# Altium footprint library Inductors&Transformers.PcbLib: 69 footprints (part 4 of 5)
Each footprint in its own frame and in the unit in brackets; x right, y up, seen from the top. Pads: shape width x height; smd on the part's side, far side on the other; paste and mask are expansions set on the pad; w line width, h text height; cw(c..) or ccw(c..) is an arc to the next point about the centre after c.
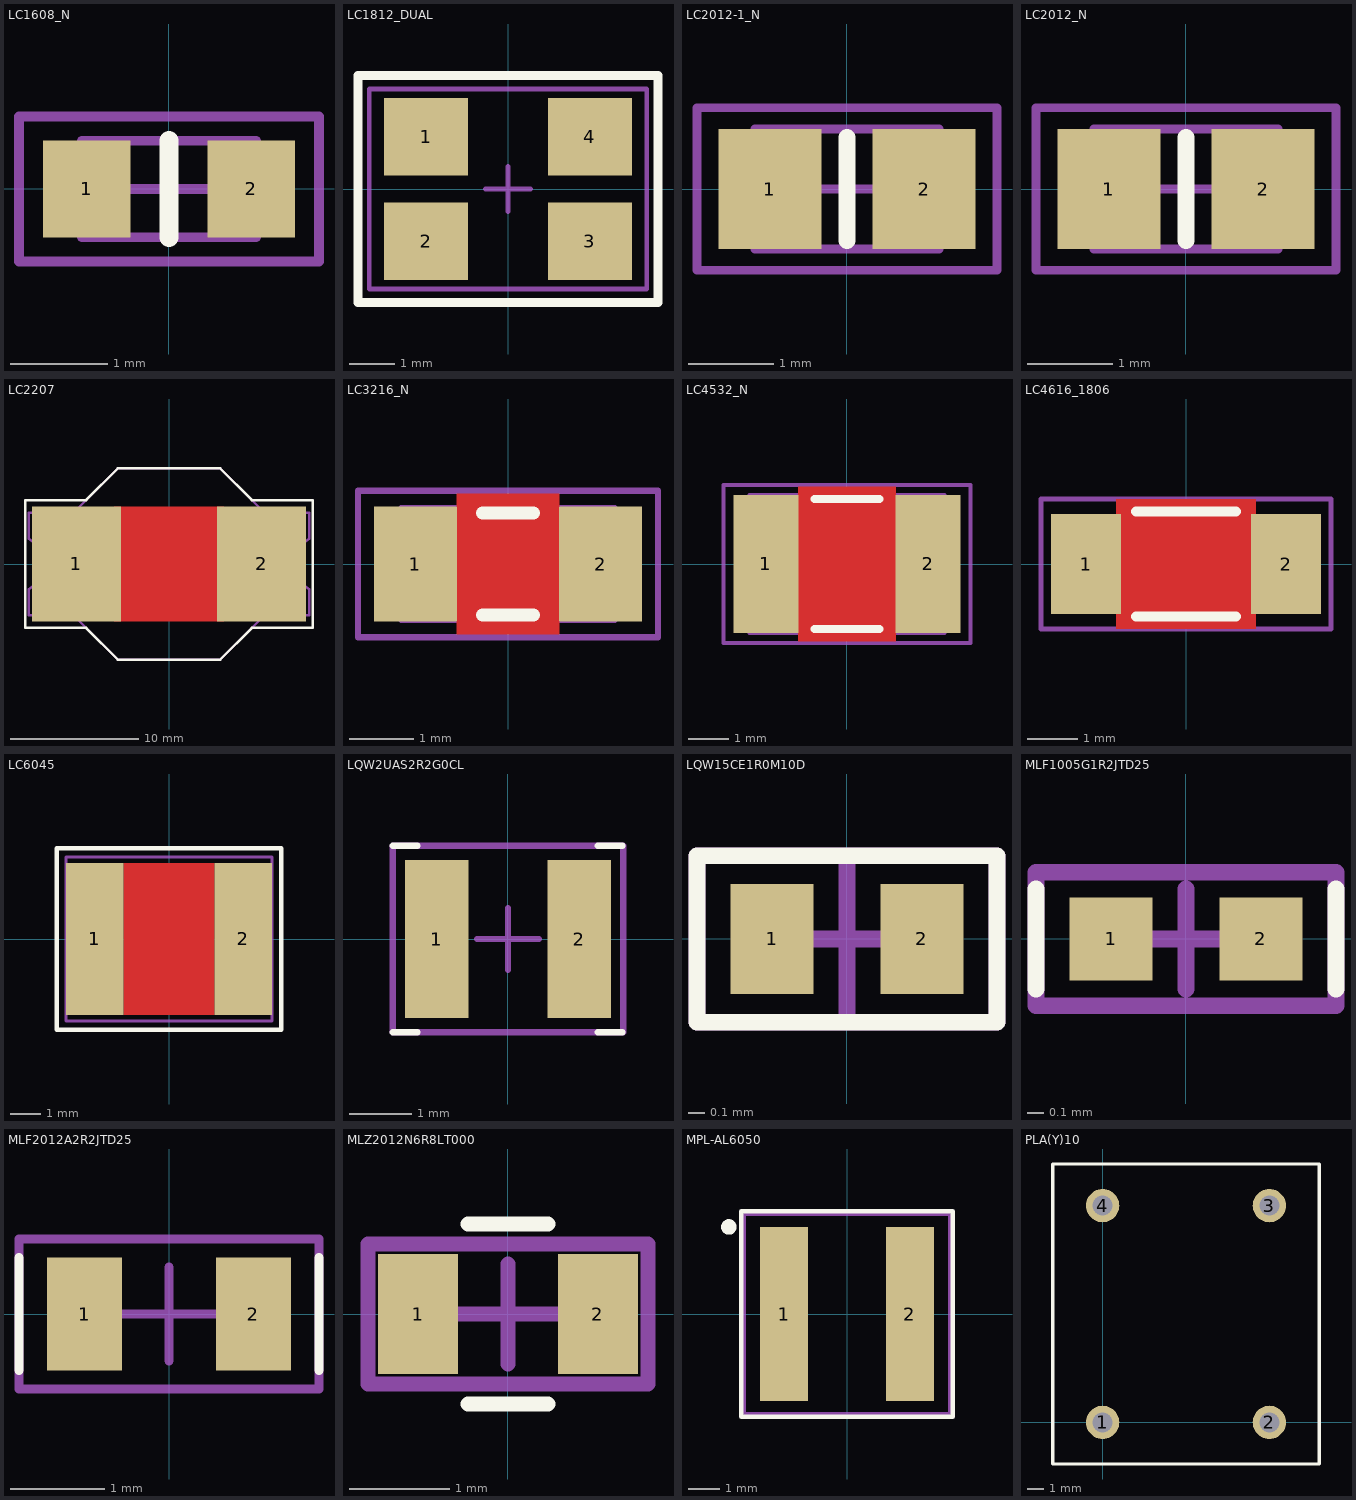
[diagram p3: the footprints below, top view; thin cyan lines are the x and y axes]

## LC1608_N [mm]
height 0.6
pads (2):
  rect 0.9x1 smd: 1(-0.85,0) 2(0.85,0)
Top Overlay:
  lines w0.2: 0,-0.5 0,0.5
Mechanical 13:
  lines w0.1: -0.6,-0.5 -0.6,0.5 ; 0.6,-0.5 0.6,0.5 ; -0.9,-0.5 0.9,-0.5 0.9,0.5 -0.9,0.5 -0.9,-0.5
Mechanical 15:
  lines w0.1: -0.475,0 0.475,0 ; 0,-0.475 0,0.475 ; -1.55,-0.75 -1.55,0.75 1.55,0.75 1.55,-0.75 -1.55,-0.75
3D body "User Library-Chip Resistor2 1608.step": height 0.8, standoff 0, extent -0.8,-0.425 0.8,0.415

## LC1812_DUAL [mm]
height 3
pads (4):
  rect 1.85x1.7 smd: 1(-1.8,1.15) 2(-1.8,-1.15) 3(1.8,-1.15) 4(1.8,1.15)
Top Overlay:
  lines w0.2: -3.3,-2.5 3.3,-2.5 3.3,2.5 -3.3,2.5 -3.3,-2.5
Mechanical 15:
  lines w0.1: -0.5,0 0.5,0 ; 0,-0.5 0,0.5 ; -3.05,-2.2 -3.05,2.2 3.05,2.2 3.05,-2.2 -3.05,-2.2
3D body "User Library-ACT45B_GERMANY.step": height 3, standoff 0, extent -2.25,-1.6 2.25,1.6

## LC2012-1_N [mm]
height 1
pads (2):
  rect 1.2x1.4 smd: 1(-0.9,0) 2(0.9,0)
Top Overlay:
  lines w0.2: 0,-0.6 0,0.6
Mechanical 13:
  lines w0.1: -0.85,-0.7 -0.85,0.7 ; 0.85,-0.7 0.85,0.7 ; -1.075,-0.7 -1.075,0.7 1.075,0.7 1.075,-0.7 -1.075,-0.7
Mechanical 15:
  lines w0.1: -0.5,0 0.5,0 ; 0,-0.5 0,0.5 ; -1.75,-0.95 -1.75,0.95 1.75,0.95 1.75,-0.95 -1.75,-0.95
3D body "User Library-L-0805B.STEP": height 1.45, standoff 0, extent -1.1,-0.7 1.1,0.7

## LC2012_N [mm]
height 0.8
pads (2):
  rect 1.2x1.4 smd: 1(-0.9,0) 2(0.9,0)
Top Overlay:
  lines w0.2: 0,-0.6 0,0.6
Mechanical 13:
  lines w0.1: -0.85,-0.7 -0.85,0.7 ; 0.85,-0.7 0.85,0.7 ; -1.075,-0.7 1.075,-0.7 1.075,0.7 -1.075,0.7 -1.075,-0.7
Mechanical 15:
  lines w0.1: -0.5,0 0.5,0 ; 0,-0.5 0,0.5 ; -1.75,-0.95 1.75,-0.95 1.75,0.95 -1.75,0.95 -1.75,-0.95
3D body "User Library-Chip Resistor2 2012.step": height 0.7, standoff 0, extent -1,-0.6 1,0.6

## LC2207 [mm] "Inductor 22x15x7"
height 7
pads (2):
  rect 7x9 smd: 1(-7.25,0) 2(7.25,0)
Top Layer:
  pour cut-out: -4.3,4.5 4.3,4.5 4.3,-4.5 -4.3,-4.5
Top Overlay:
  lines w0.2: -11.25,-5 -6.5,-5 -4,-7.5 4,-7.5 6.5,-5 11.25,-5 11.25,5 6.5,5 4,7.5 -4,7.5 -6.5,5 -11.25,5 -11.25,-5
Mechanical 15:
  lines w0.1: -0.5,0 0.5,0 ; 0,-0.5 0,0.5
  lines w0.2: -7.5,-3.5 -10,-3.5 -10,-4 -11,-4 -11,-2 -10,-1.25 -10,1.25 -11,2 -11,4 -10,4 -10,3.5 -7.5,3.5 ; 7.5,-3.5 10,-3.5 10,-4 11,-4 11,-2 10,-1.25 10,1.25 11,2 11,4 10,4 10,3.5 7.5,3.5 ; -7.5,-4 -4,-7.5 4,-7.5 7.5,-4 7.5,4 4,7.5 -4,7.5 -7.5,4 -7.5,-4
3D body "User Library-SDR2207-1.STEP": height 6, standoff 0, extent -11,-7.5 11,7.5

## LC3216_N [mm]
height 1
pads (2):
  rect 1.3x1.8 smd: 1(-1.45,0) 2(1.45,0)
Top Layer:
  pour cut-out: -0.8,1.1 0.8,1.1 0.8,-1.1 -0.8,-1.1
Top Overlay:
  lines w0.2: -0.4,-0.8 0.4,-0.8 ; -0.4,0.8 0.4,0.8
Mechanical 13:
  lines w0.1: -1.25,-0.875 -1.25,0.875 ; 1.25,-0.875 1.25,0.875 ; -1.675,-0.875 -1.675,0.875 1.675,0.875 1.675,-0.875 -1.675,-0.875
Mechanical 15:
  lines w0.1: -0.5,0 0.5,0 ; 0,-0.5 0,0.5 ; -2.35,-1.15 -2.35,1.15 2.35,1.15 2.35,-1.15 -2.35,-1.15
3D body "User Library-BLM31PG330SN1.step": height 1.11, standoff -0.01, extent -1.6,-0.8 1.6,0.82

## LC4532_N [mm]
height 2.6
pads (2):
  rect 1.6x3.4 smd: 1(-2,0) 2(2,0)
Top Layer:
  pour cut-out: -1.2,1.9 1.2,1.9 1.2,-1.9 -1.2,-1.9
Top Overlay:
  lines w0.2: -0.8,-1.6 0.8,-1.6 ; -0.8,1.6 0.8,1.6
Mechanical 13:
  lines w0.1: -1.8,-1.7 -1.8,1.7 ; 1.8,-1.7 1.8,1.7 ; -2.4,-1.7 2.4,-1.7 2.4,1.7 -2.4,1.7 -2.4,-1.7
Mechanical 15:
  lines w0.1: -0.5,0 0.5,0 ; 0,-0.5 0,0.5 ; -3.05,-1.95 3.05,-1.95 3.05,1.95 -3.05,1.95 -3.05,-1.95
3D body "User Library-L1812.step": height 2.75, standoff 0, extent -2.4,-1.7 2.4,1.7

## LC4616_1806 [mm]
height 1.6
pads (2):
  rect 1.4x2 smd: 1(-2,0) 2(2,0)
Top Layer:
  pour cut-out: -1.4,1.3 1.4,1.3 1.4,-1.3 -1.4,-1.3
Top Overlay:
  lines w0.2: -1,-1.05 1,-1.05 ; -1,1.05 1,1.05
Mechanical 15:
  lines w0.1: -0.5,0 0.5,0 ; 0,-0.5 0,0.5 ; -2.9,-1.3 2.9,-1.3 2.9,1.3 -2.9,1.3 -2.9,-1.3
3D body "User Library-BLM41P.step": height 1.6, standoff 0, extent -2.25,-0.8 2.25,0.8

## LC6045 [mm] "Inductor 6x4.8"
height 4.5
pads (2):
  rect 1.9x5 smd: 1(-2.45,0) 2(2.45,0)
Top Layer:
  pour cut-out: -1.5,2.5 1.5,2.5 1.5,-2.5 -1.5,-2.5
Top Overlay:
  lines w0.15: -3.7,-3 3.7,-3 3.7,3 -3.7,3 -3.7,-3
Mechanical 15:
  lines w0.1: -0.5,0 0.5,0 ; 0,-0.5 0,0.5 ; -3.4,-2.7 3.4,-2.7 3.4,2.7 -3.4,2.7 -3.4,-2.7
3D body "User Library-SRN6045 Series.step": height 4.5, standoff 0, extent -3.15,-3 3.15,3

## LQW2UAS2R2G0CL [mm]
pads (2):
  rect 1.02x2.54 smd mask+0.05: 1(-1.145,0) 2(1.145,0)
Top Overlay:
  lines w0.1: -1.855,-1.5 -1.455,-1.5 ; -1.855,1.5 -1.455,1.5 ; 1.445,-1.5 1.845,-1.5 ; 1.445,1.5 1.845,1.5
Mechanical 15:
  lines w0.1: -0.5,0 0.5,0 ; 0,-0.5 0,0.5 ; -1.855,-1.5 -1.855,1.5 1.855,1.5 1.855,-1.5 -1.855,-1.5
3D body "Coilcraft-1008CS.step": height 2.48, standoff -0.01, extent -1.46,-1.395 1.46,1.395

## LQW15CE1R0M10D [mm]
pads (2):
  rect 0.5x0.66 smd mask+0.05: 1(-0.45,0) 2(0.45,0)
Top Overlay:
  lines w0.1: -0.9,-0.5 -0.9,0.5 0.9,0.5 0.9,-0.5 -0.9,-0.5
Mechanical 15:
  lines w0.1: -0.5,0 0.5,0 ; 0,-0.5 0,0.5 ; -0.9,-0.5 0.9,-0.5 0.9,0.5 -0.9,0.5 -0.9,-0.5
3D body "User Library-INDC1005X50-MURATA_LQW15A.step": height 0.51, standoff 0, extent -0.5,-0.3 0.5,0.3

## MLF1005G1R2JTD25 [mm]
pads (2):
  rect 0.5x0.5 smd mask+0.05: 1(-0.45,0) 2(0.45,0)
Top Overlay:
  lines w0.1: -0.9,-0.3 -0.9,0.3 ; 0.9,-0.3 0.9,0.3
Mechanical 15:
  lines w0.1: -0.3,0 0.3,0 ; 0,-0.3 0,0.3 ; -0.9,-0.4 0.9,-0.4 0.9,0.4 -0.9,0.4 -0.9,-0.4
3D body "User Library-d0402h025.step": height 0.25, standoff 0, extent -0.5,-0.25 0.5,0.25

## MLF2012A2R2JTD25 [mm]
pads (2):
  rect 0.8x1.2 smd: 1(-0.9,0) 2(0.9,0)
Top Overlay:
  lines w0.1: -1.6,-0.6 -1.6,0.6 ; 1.6,-0.6 1.6,0.6
Mechanical 15:
  lines w0.1: -0.5,0 0.5,0 ; 0,-0.5 0,0.5 ; -1.6,-0.8 1.6,-0.8 1.6,0.8 -1.6,0.8 -1.6,-0.8
3D body "74479032.stp": height 1.25, standoff 0, extent -1,-0.625 1,0.625

## MLZ2012N6R8LT000 [mm]
pads (2):
  rect 0.8x1.2 smd mask+0.08: 1(-0.9,0) 2(0.9,0)
Top Overlay:
  lines w0.15: -0.4,-0.9 0.4,-0.9 ; -0.4,0.9 0.4,0.9
Mechanical 15:
  lines w0.15: -0.5,0 0.5,0 ; 0,-0.5 0,0.5 ; -1.4,-0.7 1.4,-0.7 1.4,0.7 -1.4,0.7 -1.4,-0.7
3D body "74479032.stp": height 1.25, standoff 0, extent -1,-0.625 1,0.625

## MPL-AL6050 [mm] "Low-Profile Molded Inductor"
height 4.8
pads (2):
  rect 1.55x5.6 smd: 1(-2.025,0) 2(2.025,0)
Top Overlay:
  circle w0.3: c-3.8,2.8 r0.1
  lines w0.15: -3.4,-3.3 3.4,-3.3 3.4,3.3 -3.4,3.3 -3.4,-3.3
Mechanical 13:
  lines w0.1: -3.3,-3.2 3.3,-3.2 3.3,3.2 -3.3,3.2 -3.3,-3.2
3D body "MPL-AL6050-4R7.STEP": height 4.8, standoff 0, extent -3.2,-3.3 3.2,3.3

## PLA(Y)10 [mm]
height 17.501
pads (4):
  round 2 hole 1.2: 1(0,0) 2(10,0) 3(10,13) 4(0,13)
Top Overlay:
  lines w0.2: -3,-2.5 13,-2.5 13,15.5 -3,15.5 -3,-2.5
3D body "User Library-PLA10-1.STEP": height 17.3, standoff -2.3, extent -2.5,-1.885 12.5,14.907